# Altium footprint library 3.22-杂项.PcbLib: 199 footprints (part 2 of 15)
Each footprint in its own frame and in the unit in brackets; x right, y up, seen from the top. Pads: shape width x height; smd on the part's side, far side on the other; paste and mask are expansions set on the pad; w line width, h text height; cw(c..) or ccw(c..) is an arc to the next point about the centre after c.
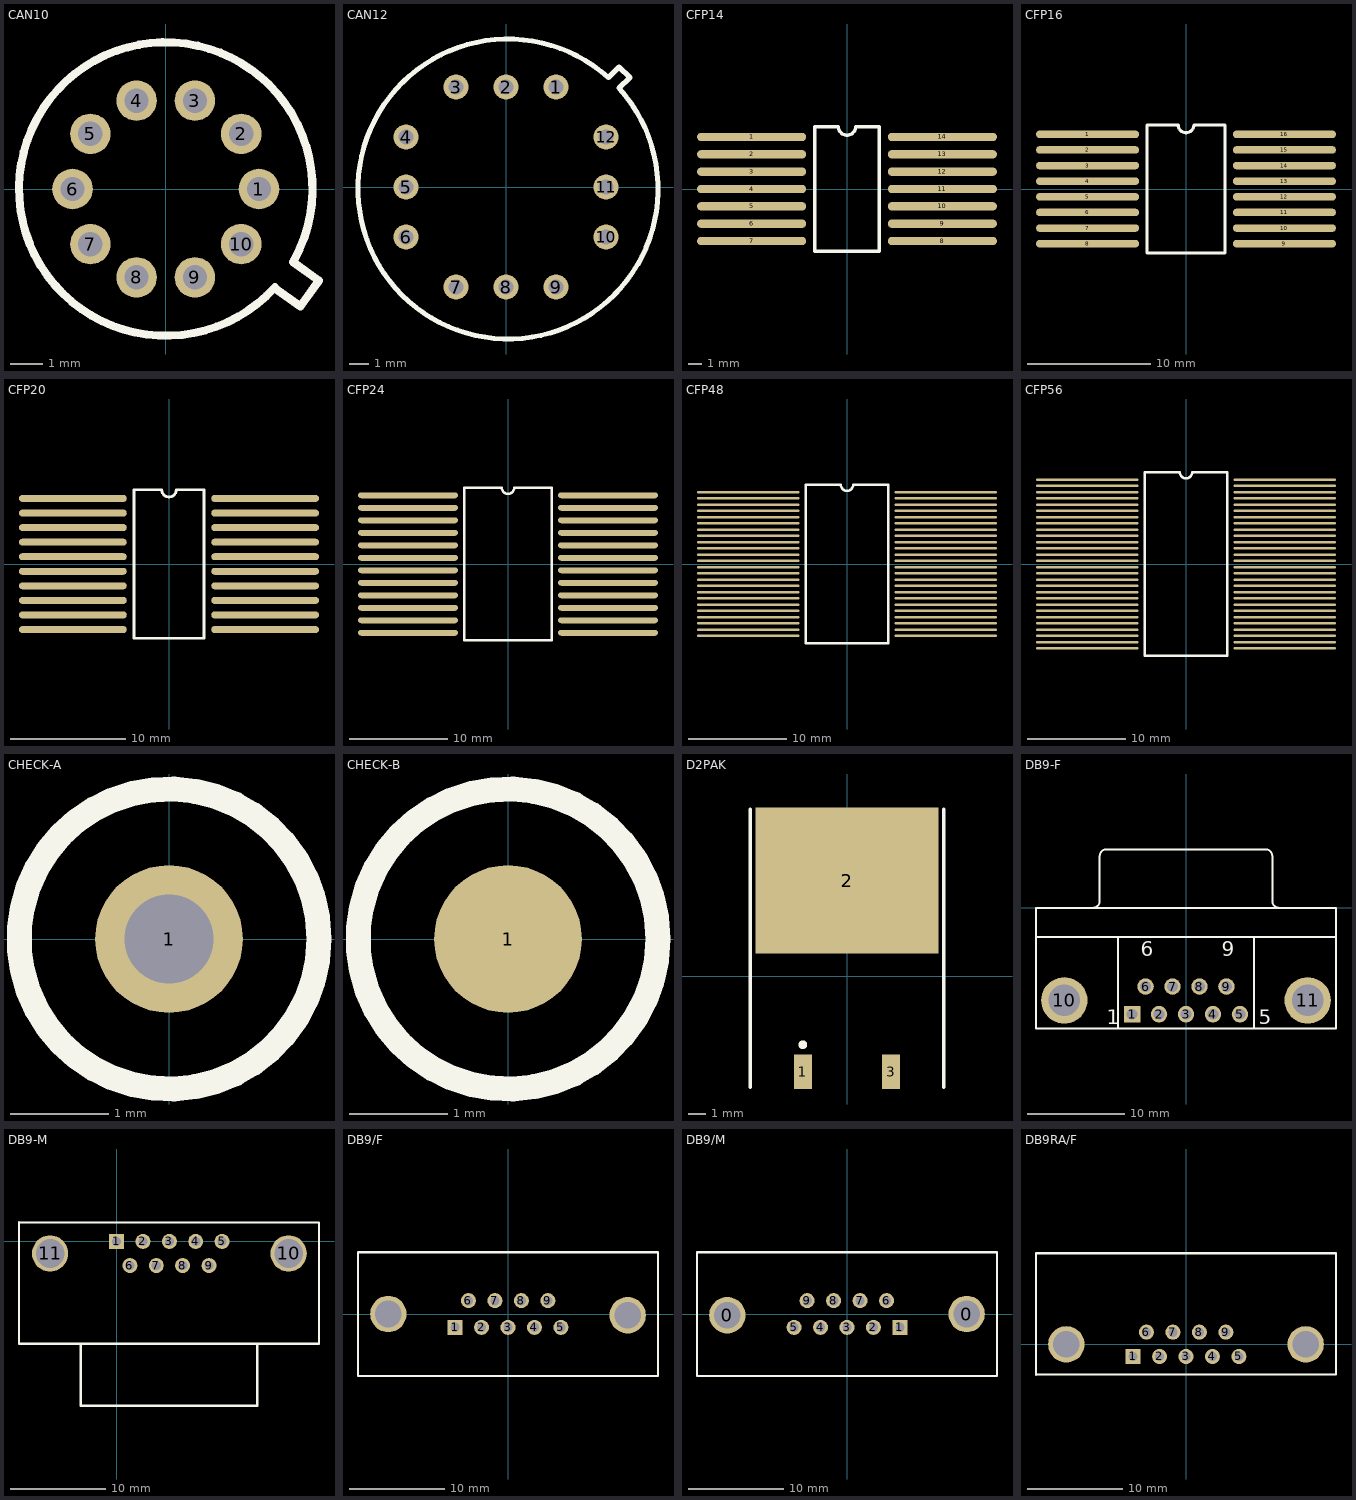
[diagram p1: the footprints below, top view; thin cyan lines are the x and y axes]

## CAN10 [mil]
pads (10):
  round 50 hole 30: 1(115,0) 2(93,68) 3(36,109) 4(-36,109) 5(-93,68) 6(-115,0) 7(-93,-68) 8(-36,-109) 9(36,-109) 10(93,-68)
Top Overlay:
  lines w10: 134,-122 166,-145 189,-113 157,-90 ; 134.51,-121.11 cw(c0,0) 158.31,-87.75

## CAN12 [mil]
pads (12):
  round 50 hole 30: 1(100,200) 2(0,200) 3(-100,200) 4(-200,100) 5(-200,0) 6(-200,-100) 7(-100,-200) 8(0,-200) 9(100,-200) 10(200,-100) 11(200,0) 12(200,100)
Top Overlay:
  lines w10: 204.74,218.94 ccw(c4,-4) 226.94,196.74 ; 205,219 226,240 248,219 226,198

## CFP14 [mil]
pads (14):
  oval 315x24 smd: 1(-275,150) 2(-275,100) 3(-275,50) 4(-275,0) 5(-275,-50) 6(-275,-100) 7(-275,-150) 8(275,-150) 9(275,-100) 10(275,-50) 11(275,0) 12(275,50) 13(275,100) 14(275,150)
Top Overlay:
  lines w10: -93,-180 93,-180 93,180 25,180 cw(c0,180) -25,180 -93,180 -93,-180

## CFP16 [mil]
pads (16):
  oval 330x24 smd: 1(-315,175) 2(-315,125) 3(-315,75) 4(-315,25) 5(-315,-25) 6(-315,-75) 7(-315,-125) 8(-315,-175) 9(315,-175) 10(315,-125) 11(315,-75) 12(315,-25) 13(315,25) 14(315,75) 15(315,125) 16(315,175)
Top Overlay:
  lines w10: -125,-205 125,-205 125,205 25,205 cw(c0,205) -25,205 -125,205 -125,-205

## CFP20 [mil]
pads (20):
  oval 370x24 smd: 1(-330,225) 2(-330,175) 3(-330,125) 4(-330,75) 5(-330,25) 6(-330,-25) 7(-330,-75) 8(-330,-125) 9(-330,-175) 10(-330,-225) 11(330,-225) 12(330,-175) 13(330,-125) 14(330,-75) 15(330,-25) 16(330,25) 17(330,75) 18(330,125) 19(330,175) 20(330,225)
Top Overlay:
  lines w10: -120,-255 120,-255 120,255 25,255 cw(c0,255) -25,255 -120,255 -120,-255

## CFP24 [mil]
pads (24):
  oval 400x24 smd: 1(-400,275) 2(-400,225) 3(-400,175) 4(-400,125) 5(-400,75) 6(-400,25) 7(-400,-25) 8(-400,-75) 9(-400,-125) 10(-400,-175) 11(-400,-225) 12(-400,-275) 13(400,-275) 14(400,-225) 15(400,-175) 16(400,-125) 17(400,-75) 18(400,-25) 19(400,25) 20(400,75) 21(400,125) 22(400,175) 23(400,225) 24(400,275)
Top Overlay:
  lines w10: -175,-305 -175,305 -25,305 ccw(c0,305) 25,305 175,305 175,-305 -175,-305

## CFP48 [mil]
pads (48):
  oval 410x10 smd: 1(-395,287.5) 2(-395,262.5) 3(-395,237.5) 4(-395,212.5) 5(-395,187.5) 6(-395,162.5) 7(-395,137.5) 8(-395,112.5) 9(-395,87.5) 10(-395,62.5) 11(-395,37.5) 12(-395,12.5) 13(-395,-12.5) 14(-395,-37.5) 15(-395,-62.5) 16(-395,-87.5) 17(-395,-112.5) 18(-395,-137.5) 19(-395,-162.5) 20(-395,-187.5) 21(-395,-212.5) 22(-395,-237.5) 23(-395,-262.5) 24(-395,-287.5) 25(395,-287.5) 26(395,-262.5) 27(395,-237.5) 28(395,-212.5) 29(395,-187.5) 30(395,-162.5) 31(395,-137.5) 32(395,-112.5) 33(395,-87.5) 34(395,-62.5) 35(395,-37.5) 36(395,-12.5) 37(395,12.5) 38(395,37.5) 39(395,62.5) 40(395,87.5) 41(395,112.5) 42(395,137.5) 43(395,162.5) 44(395,187.5) 45(395,212.5) 46(395,237.5) 47(395,262.5) 48(395,287.5)
Top Overlay:
  lines w10: -165,-317.5 165,-317.5 165,317.5 25,317.5 cw(c0,317.5) -25,317.5 -165,317.5 -165,-317.5

## CFP56 [mil]
pads (56):
  oval 410x10 smd: 1(-395,337.5) 2(-395,312.5) 3(-395,287.5) 4(-395,262.5) 5(-395,237.5) 6(-395,212.5) 7(-395,187.5) 8(-395,162.5) 9(-395,137.5) 10(-395,112.5) 11(-395,87.5) 12(-395,62.5) 13(-395,37.5) 14(-395,12.5) 15(-395,-12.5) 16(-395,-37.5) 17(-395,-62.5) 18(-395,-87.5) 19(-395,-112.5) 20(-395,-137.5) 21(-395,-162.5) 22(-395,-187.5) 23(-395,-212.5) 24(-395,-237.5) 25(-395,-262.5) 26(-395,-287.5) 27(-395,-312.5) 28(-395,-337.5) 29(395,-337.5) 30(395,-312.5) 31(395,-287.5) 32(395,-262.5) 33(395,-237.5) 34(395,-212.5) 35(395,-187.5) 36(395,-162.5) 37(395,-137.5) 38(395,-112.5) 39(395,-87.5) 40(395,-62.5) 41(395,-37.5) 42(395,-12.5) 43(395,12.5) 44(395,37.5) 45(395,62.5) 46(395,87.5) 47(395,112.5) 48(395,137.5) 49(395,162.5) 50(395,187.5) 51(395,212.5) 52(395,237.5) 53(395,262.5) 54(395,287.5) 55(395,312.5) 56(395,337.5)
Top Overlay:
  lines w10: -165,-367.5 -165,367.5 -25,367.5 ccw(c0,367.5) 25,367.5 165,367.5 165,-367.5 -165,-367.5

## CHECK-A [mm] "Connector; Plug"
height 1.45
pads (1):
  round 1.5 hole 0.9: 1(0,0)
Top Overlay:
  circle w0.254: c0,0 r1.524

## CHECK-B [mm] "Connector; Plug"
height 1.45
pads (1):
  round 1.5 smd: 1(0,0)
Top Overlay:
  circle w0.254: c0,0 r1.524

## D2PAK [mm] "D2-PAK/TO-263-AB; 3 Leads (1 Cropped); Body 15.5 (inc. leads) x 10.5 mm (LxW max)"
height 4.69
pads (3):
  rect 1.05x2 smd: 1(-2.54,-5.5) 3(2.54,-5.5)
  rect 10.55x8.4 smd: 2(0,5.5)
Top Overlay:
  circle w0.25: c-2.54,-3.95 r0.125
  lines w0.2: -5.575,-6.4 -5.575,9.6 ; 5.575,-6.4 5.575,9.6

## DB9-F [mm] "DB9母座"
height 12.75
pads (11):
  rect 1.69x1.69 hole 1.09: 1(-5.54,-10.92)
  round 1.69 hole 1.09: 2(-2.77,-10.92) 3(0,-10.92) 4(2.77,-10.92) 5(5.54,-10.92) 6(-4.155,-8.08) 7(-1.385,-8.08) 8(1.385,-8.08) 9(4.155,-8.08)
  round 4.76 hole 3.26: 10(-12.495,-9.5) 11(12.495,-9.5)
Top Overlay:
  lines w0.2: -15.4,-3 15.4,-3 ; -9.56,0.005 ccw(c-9.56,0.7) -8.865,0.7 -8.865,5.3 ; -8.86,5.305 cw(c-8.165,5.305) -8.165,6 8.165,6 cw(c8.165,5.305) 8.86,5.305 ; -7,-12.4 -7,-3 ; 7,-12.4 7,-3 ; 8.865,5.3 8.865,0.7 ccw(c9.56,0.7) 9.56,0.005 ; -15.4,-12.4 15.4,-12.4 15.4,0 -15.4,0 -15.4,-12.4
  text "6" at -4.655,-4.975 h1.5
  text "9" at 3.655,-4.975 h1.5
  text "5" at 7.493,-11.938 h1.5
  text "1" at -8.128,-11.938 h1.5

## DB9-M [mil] "DB9公座"
height 393.7
pads (11):
  rect 62x62 hole 38: 1(0,0)
  round 62 hole 38: 2(109,0) 3(218,0) 4(327,0) 5(436,0) 6(55,-100) 7(164,-100) 8(273,-100) 9(382,-100)
  round 150 hole 118.11: 10(711,-50) 11(-275,-50)
Top Overlay:
  lines w8: -403.54,78.74 836.61,78.74 836.61,-423.23
  lines w10: -403.54,78.74 -403.54,-423.23 836.61,-423.23 ; -147.64,-425 -147.64,-679.13 580.71,-679.13 580.71,-425
3D body: height 393.7, standoff 0, extent -405,-425 835,75
3D body: height 314.96, standoff 0, extent -145,-680 580,-425

## DB9/F [mil]
pads (11):
  rect 62x62 hole 38: 1(-218,-55)
  round 62 hole 38: 2(-109,-55) 3(0,-55) 4(109,-55) 5(218,-55) 6(-163,55) 7(-54,55) 8(55,55) 9(164,55)
  round 150 hole 110: ""(-493,0) ""(493,-5)
Top Overlay:
  lines w8: -618,-255 618,-255 618,255
  lines w10: -618,-255 -618,255 618,255

## DB9/M [mil]
pads (11):
  round 150 hole 110: 0(-493,-5) 0(493,0)
  rect 62x62 hole 38: 1(218,-55)
  round 62 hole 38: 2(109,-55) 3(0,-55) 4(-109,-55) 5(-218,-55) 6(163,55) 7(54,55) 8(-55,55) 9(-164,55)
Top Overlay:
  lines w8: -618,255 -618,-255 618,-255
  lines w10: -618,255 618,255 618,-255

## DB9RA/F [mil]
pads (11):
  rect 62x62 hole 38: 1(-218,-50)
  round 62 hole 38: 2(-109,-50) 3(0,-50) 4(109,-50) 5(218,-50) 6(-163,50) 7(-54,50) 8(55,50) 9(164,50)
  round 150 hole 110: ""(-493,0) ""(493,0)
Top Overlay:
  lines w8: -618,-125 618,-125 618,375
  lines w10: -618,-125 -618,375 618,375